# Altium footprint library NX Module baseboard.PcbLib: 96 footprints (part 1 of 6)
Each footprint in its own frame and in the unit in brackets; x right, y up, seen from the top. Pads: shape width x height; smd on the part's side, far side on the other; paste and mask are expansions set on the pad; w line width, h text height; cw(c..) or ccw(c..) is an arc to the next point about the centre after c.
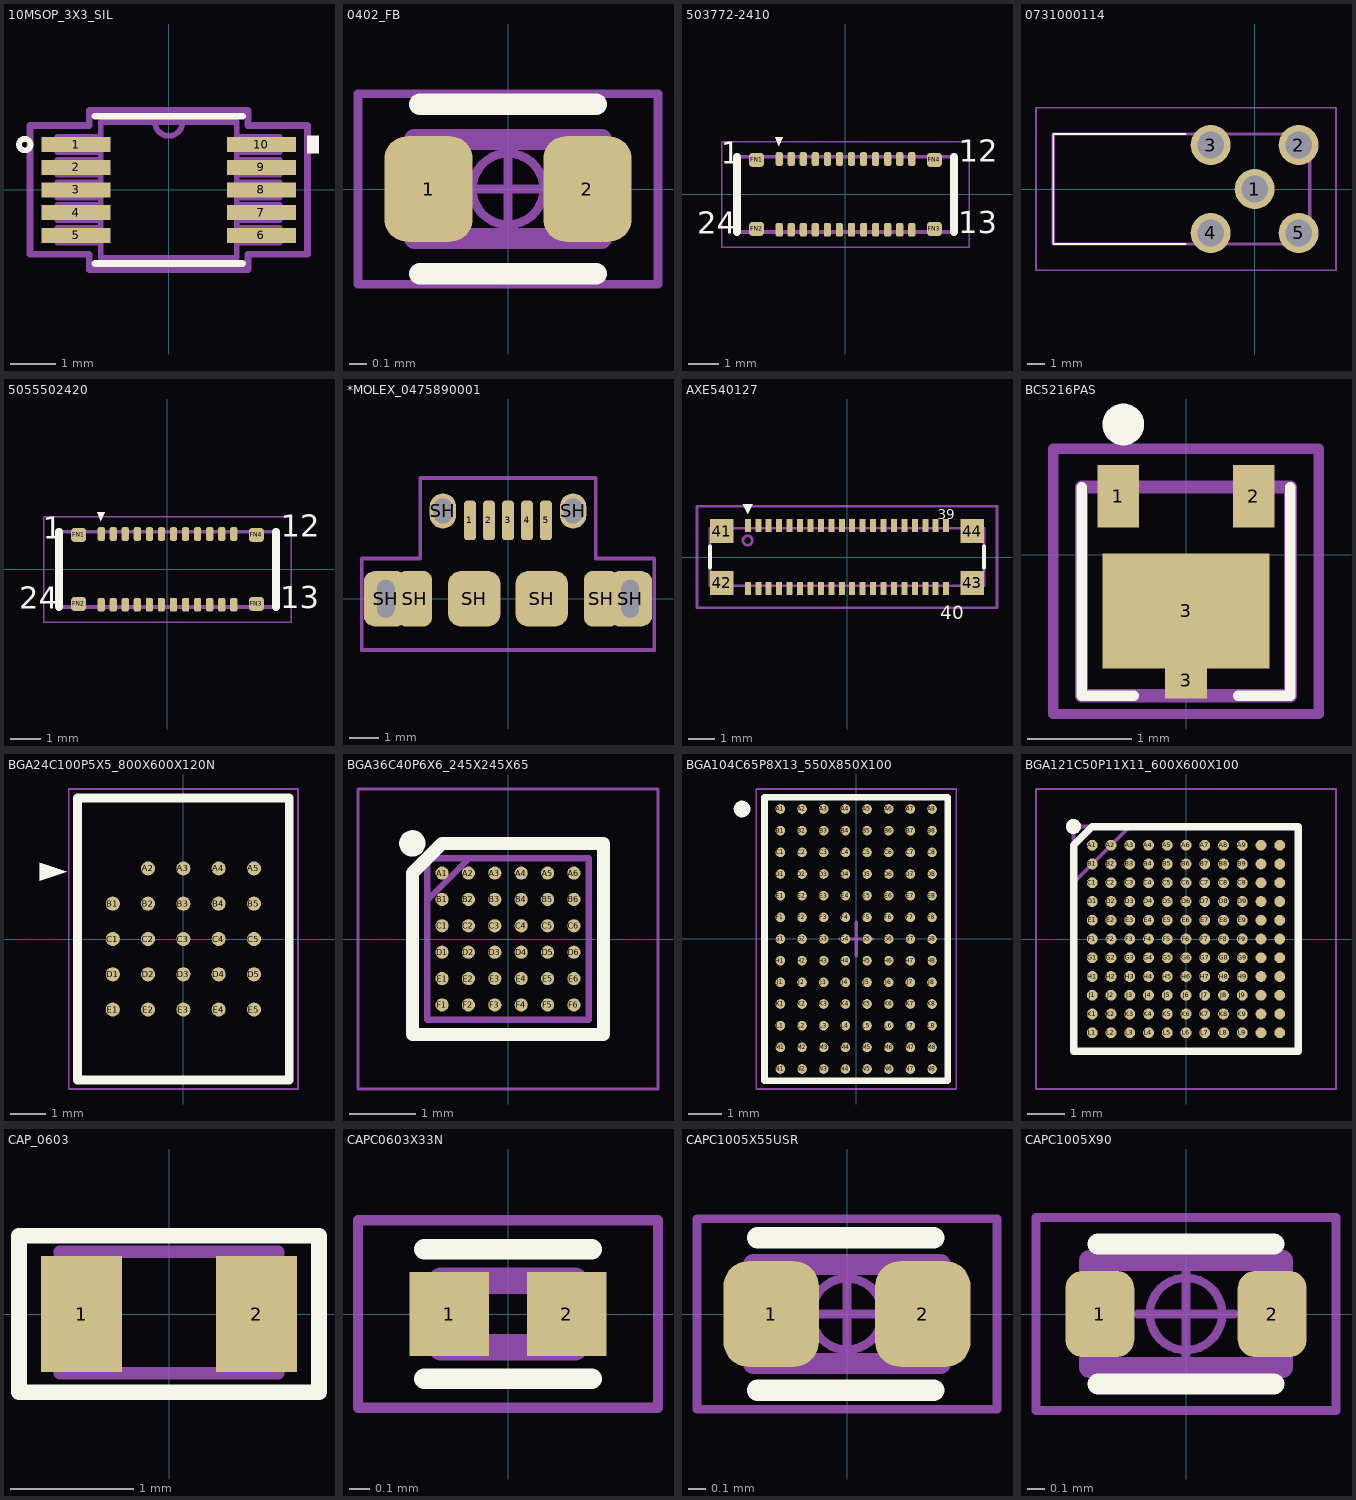
[diagram p0: the footprints below, top view; thin cyan lines are the x and y axes]

## 10MSOP_3X3_SIL [mil]
pads (10):
  rect 60x13 smd paste+0 mask+0: 1(-80.5,39.37) 2(-80.5,19.68) 3(-80.5,0) 4(-80.5,-19.68) 5(-80.5,-39.37) 6(80.5,-39.37) 7(80.5,-19.68) 8(80.5,0) 9(80.5,19.68) 10(80.5,39.37)
Top Overlay:
  circle w5: c-125,39.37 r5
  region: 120.5,46.87 130.5,46.87 130.5,31.87 120.5,31.87
  lines w6: -64,-64 64,-64 ; -64,64 64,64
Mechanical 13:
  lines w5: -12,59 ccw(c0,59) 12,59 ; -96.5,-45.87 -59,-45.87 -59,-32.87 -96.5,-32.87 -96.5,-45.87 ; -96.5,-26.18 -59,-26.18 -59,-13.19 -96.5,-13.19 -96.5,-26.18 ; -96.5,-6.5 -59,-6.5 -59,6.5 -96.5,6.5 -96.5,-6.5 ; -96.5,13.19 -59,13.19 -59,26.18 -96.5,26.18 -96.5,13.19 ; -96.5,32.87 -59,32.87 -59,45.87 -96.5,45.87 -96.5,32.87 ; -59,-59 -59,59 59,59 59,-59 -59,-59 ; 59,-45.87 96.5,-45.87 96.5,-32.87 59,-32.87 59,-45.87 ; 59,-26.18 96.5,-26.18 96.5,-13.19 59,-13.19 59,-26.18 ; 59,-6.5 96.5,-6.5 96.5,6.5 59,6.5 59,-6.5 ; 59,13.19 96.5,13.19 96.5,26.18 59,26.18 59,13.19 ; 59,32.87 96.5,32.87 96.5,45.87 59,45.87 59,32.87
  text ".Designator" at -26.12,-15.85 h60
Mechanical 15:
  lines w6: -120.5,-55.87 -69,-55.87 -69,-69 69,-69 69,-55.87 120.5,-55.87 120.5,55.87 69,55.87 69,69 -69,69 -69,55.87 -120.5,55.87 -120.5,-55.87
3D body "10MSOP_3X3_SIL.step": height 43.11, standoff 0, extent -96.5,-59.02 96.5,59.02

## 0402_FB [mm] "Resistor, Chip; 1.00 mm L X 0.50 mm W X 0.40 mm H body"
height 0.4
pads (2):
  rrect52% 0.5x0.6 smd mask+0.051: 1(-0.45,0) 2(0.45,0)
Top Overlay:
  lines w0.12: -0.5,-0.48 0.5,-0.48 ; -0.5,0.48 0.5,0.48
Mechanical 13:
  lines w0.12: -0.53,-0.28 0.53,-0.28 0.53,0.28 -0.53,0.28 -0.53,-0.28
  text ".Designator" at 0.911,-0.474 h1.52
Mechanical 15:
  circle w0.05: c0,0 r0.202
  lines w0.05: -0.27,0 0.27,0 ; 0,-0.27 0,0.27 ; -0.85,-0.54 0.85,-0.54 0.85,0.54 -0.85,0.54 -0.85,-0.54
3D body "LQP15MN2N7B02D--3DModel-STEP-56544.STEP": height 0.43, standoff -0.02, extent -0.5,-0.25 0.5,0.25

## 503772-2410 [mm]
pads (28):
  rrect50% 0.24x0.45 smd: 1(-2.2,1.175) 2(-1.8,1.175) 3(-1.4,1.175) 4(-1,1.175) 5(-0.6,1.175) 6(-0.2,1.175) 7(0.2,1.175) 8(0.6,1.175) 9(1,1.175) 10(1.4,1.175) 11(1.8,1.175) 12(2.2,1.175) 13(2.2,-1.175) 14(1.8,-1.175) 15(1.4,-1.175) 16(1,-1.175) 17(0.6,-1.175) 18(0.2,-1.175) 19(-0.2,-1.175) 20(-0.6,-1.175) 21(-1,-1.175) 22(-1.4,-1.175) 23(-1.8,-1.175) 24(-2.2,-1.175)
  rrect50% 0.5x0.47 smd: FN1(-2.95,1.145) FN2(-2.95,-1.145) FN3(2.95,-1.145) FN4(2.95,1.145)
Top Overlay:
  region: -2.21,1.6 -2.083,1.905 -2.337,1.905
  lines w0.254: -3.6,-1.25 -3.6,1.25 ; 3.6,-1.25 3.6,1.25
  text "1" at -4.14,0.762 h1.27
  text "12" at 3.759,0.838 h1.27
  text "13" at 3.751,-1.535 h1.27
  text "24" at -4.929,-1.549 h1.27
Mechanical 13:
  lines w0.127: -3.6,-1.25 3.6,-1.25 3.6,1.25 -3.6,1.25 -3.6,-1.25
  text ".Designator" at -0.831,-0.274 h1.27
Mechanical 15:
  lines w0.05: -4.1,-1.75 -4.1,1.75 4.1,1.75 4.1,-1.75 -4.1,-1.75
3D body "5037722410.stp": height 0.66, standoff 0, extent -3.6,-1.25 3.6,1.25

## 0731000114 [mm]
pads (5):
  round 2.31 hole 1.54: 1(0,0) 2(2.54,2.54) 3(-2.54,2.54) 4(-2.54,-2.54) 5(2.54,-2.54)
Top Overlay:
  lines w0.1: -4,-3.175 -11.625,-3.175 -11.625,3.175 -4,3.175
Mechanical 13:
  lines w0.2: -11.625,-3.175 3.175,-3.175 3.175,3.175 -11.625,3.175 -11.625,-3.175
  text ".Designator" at -5.449,-0.365 h1.27
Mechanical 15:
  lines w0.1: -12.625,-4.695 4.695,-4.695 4.695,4.695 -12.625,4.695 -12.625,-4.695
3D body "731000114.stp": height 9.67, standoff -3.83, extent -11.625,-3.175 3.175,3.175

## 5055502420 [mm]
pads (28):
  rrect50% 0.24x0.45 smd: 1(-2.2,1.175) 2(-1.8,1.175) 3(-1.4,1.175) 4(-1,1.175) 5(-0.6,1.175) 6(-0.2,1.175) 7(0.2,1.175) 8(0.6,1.175) 9(1,1.175) 10(1.4,1.175) 11(1.8,1.175) 12(2.2,1.175) 13(2.2,-1.175) 14(1.8,-1.175) 15(1.4,-1.175) 16(1,-1.175) 17(0.6,-1.175) 18(0.2,-1.175) 19(-0.2,-1.175) 20(-0.6,-1.175) 21(-1,-1.175) 22(-1.4,-1.175) 23(-1.8,-1.175) 24(-2.2,-1.175)
  rrect50% 0.5x0.47 smd: FN1(-2.95,1.145) FN2(-2.95,-1.145) FN3(2.95,-1.145) FN4(2.95,1.145)
Top Overlay:
  region: -2.21,1.6 -2.083,1.905 -2.337,1.905
  lines w0.254: -3.6,-1.25 -3.6,1.25 ; 3.6,-1.25 3.6,1.25
  text "1" at -4.14,0.762 h1.27
  text "12" at 3.759,0.838 h1.27
  text "13" at 3.751,-1.535 h1.27
  text "24" at -4.929,-1.549 h1.27
Mechanical 13:
  lines w0.127: -3.55,-1.25 3.55,-1.25 3.55,1.25 -3.55,1.25 -3.55,-1.25
  text ".Designator" at -0.831,-0.274 h1.27
Mechanical 15:
  lines w0.05: -4.1,-1.75 -4.1,1.75 4.1,1.75 4.1,-1.75 -4.1,-1.75
3D body "5055502420.stp": height 0.66, standoff 0, extent -3.55,-1.25 3.55,1.25

## *MOLEX_0475890001 [mm]
pads (13):
  rrect50% 0.4x1.35 smd mask+0.051: 1(-1.3,2.675) 2(-0.65,2.675) 3(0,2.675) 4(0.65,2.675) 5(1.3,2.675)
  rrect50% 1.5x1.9 hole 0.6 slot 1.3 at 90 deg: SH(-4.175,0) SH(4.175,0)
  rrect50% 1.175x1.9 smd: SH(-3.187,0) SH(3.187,0)
  oval 0.9x1.2 hole 0.65 slot 0.85 at 90 deg: SH(-2.225,3) SH(2.225,3)
  rrect50% 1.8x1.9 smd: SH(-1.15,0) SH(1.15,0)
Mechanical 13:
  lines w0.127: -5,-1.75 5,-1.75 5,1.375 3,1.375 3,4.125 -3,4.125 -3,1.375 -5,1.375 -5,-1.75
  text ".Designator" at -1.524,-0.33 h1.27
3D body "475890001.stp": height 2.74, standoff -0.57, extent -4.325,-2.719 4.325,3.175

## AXE540127 [mm]
pads (44):
  rect 0.23x0.5 smd mask+0.05: 1(-3.8,1.2) 2(-3.8,-1.2) 3(-3.4,1.2) 4(-3.4,-1.2) 5(-3,1.2) 6(-3,-1.2) 7(-2.6,1.2) 8(-2.6,-1.2) 9(-2.2,1.2) 10(-2.2,-1.2) 11(-1.8,1.2) 12(-1.8,-1.2) 13(-1.4,1.2) 14(-1.4,-1.2) 15(-1,1.2) 16(-1,-1.2) 17(-0.6,1.2) 18(-0.6,-1.2) 19(-0.2,1.2) 20(-0.2,-1.2) 21(0.2,1.2) 22(0.2,-1.2) 23(0.6,1.2) 24(0.6,-1.2) 25(1,1.2) 26(1,-1.2) 27(1.4,1.2) 28(1.4,-1.2) 29(1.8,1.2) 30(1.8,-1.2) 31(2.2,1.2) 32(2.2,-1.2) 33(2.6,1.2) 34(2.6,-1.2) 35(3,1.2) 36(3,-1.2) 37(3.4,1.2) 38(3.4,-1.2) 39(3.8,1.2) 40(3.8,-1.2)
  rect 0.9x0.92 smd mask+0.05: 41(-4.8,0.99) 42(-4.8,-0.99) 43(4.8,-0.99) 44(4.8,0.99)
Top Overlay:
  region: -3.81,1.651 -3.619,2.032 -4,2.032
  lines w0.152: -5.25,-0.4 -5.25,0.4 ; 5.25,-0.4 5.25,0.4
  text "39" at 3.485,1.31 h0.64
  text "40" at 3.575,-2.566 h0.89
Mechanical 13:
  circle w0.102: c-3.81,0.635 r0.18
  lines w0.102: -5.25,-1.1 -5.25,1.1 5.25,1.1 5.25,-1.1 -5.25,-1.1
  text ".Designator" at -0.43,-0.365 h1.52
Mechanical 15:
  lines w0.1: -5.75,-1.95 -5.75,1.95 5.75,1.95 5.75,-1.95 -5.75,-1.95
3D body "axe540127.step": height 0.77, standoff 0, extent -5.25,-1.25 5.25,1.25

## BC5216PAS [mm]
pads (4):
  rect 0.4x0.6 smd mask+0.051: 1(-0.65,0.563) 2(0.65,0.563)
  rect 0.4x0.35 smd mask+0.051: 3(0,-1.2)
  rect 1.6x1.1 smd mask+0.051: 3(0,-0.537)
Top Overlay:
  lines w0.1: -1,0.65 -1,-1.35 -0.5,-1.35 ; 0.5,-1.35 1,-1.35 1,0.65
  lines w0.2: -0.7,1.25 cw(c-0.6,1.25) -0.5,1.25 cw(c-0.6,1.25) -0.7,1.25
Mechanical 13:
  lines w0.127: -1,-1.35 1,-1.35 1,0.65 -1,0.65 -1,-1.35
  text ".Designator" at -0.543,-0.683 h1.27
Mechanical 15:
  lines w0.1: -1.27,-1.524 -1.27,1.016 1.27,1.016 1.27,-1.524 -1.27,-1.524

## BGA24C100P5X5_800X600X120N [mm]
pads (24):
  round 0.4 smd mask+0.05: A2(-1,2) A3(0,2) A4(1,2) A5(2,2) B1(-2,1) B2(-1,1) B3(0,1) B4(1,1) B5(2,1) C1(-2,0) C2(-1,0) C3(0,0) C4(1,0) C5(2,0) D1(-2,-1) D2(-1,-1) D3(0,-1) D4(1,-1) D5(2,-1) E1(-2,-2) E2(-1,-2) E3(0,-2) E4(1,-2) E5(2,-2)
Top Overlay:
  region: -3.302,1.905 -4.064,2.159 -4.064,1.651
  lines w0.254: -3,-4 -3,4 3,4 3,-4 -3,-4
Mechanical 13:
  region: -3.302,1.905 -4.064,2.159 -4.064,1.651
  lines w0.127: -3,-4 -3,4 3,4 3,-4 -3,-4
  text ".Designator" at 0.381,-0.33 h1.27
Mechanical 15:
  lines w0.05: -3.25,-4.25 -3.25,4.25 3.25,4.25 3.25,-4.25 -3.25,-4.25
3D body "IS66WVH16M8ALL-166B1LI--3DModel-STEP-56544.STEP": height 1.2, standoff 0, extent -3,-4 3,4

## BGA36C40P6X6_245X245X65 [mm]
pads (36):
  round 0.2 smd: A1(-1,1) A2(-0.6,1) A3(-0.2,1) A4(0.2,1) A5(0.6,1) A6(1,1) B1(-1,0.6) B2(-0.6,0.6) B3(-0.2,0.6) B4(0.2,0.6) B5(0.6,0.6) B6(1,0.6) C1(-1,0.2) C2(-0.6,0.2) C3(-0.2,0.2) C4(0.2,0.2) C5(0.6,0.2) C6(1,0.2) D1(-1,-0.2) D2(-0.6,-0.2) D3(-0.2,-0.2) D4(0.2,-0.2) D5(0.6,-0.2) D6(1,-0.2) E1(-1,-0.6) E2(-0.6,-0.6) E3(-0.2,-0.6) E4(0.2,-0.6) E5(0.6,-0.6) E6(1,-0.6) F1(-1,-1) F2(-0.6,-1) F3(-0.2,-1) F4(0.2,-1) F5(0.6,-1) F6(1,-1)
Top Overlay:
  circle w0.2: c-1.45,1.45 r0.1
  lines w0.2: -1.45,-1.45 1.45,-1.45 1.45,1.45 -1,1.45 -1.45,1 -1.45,-1.45
Mechanical 13:
  lines w0.1: -1.225,0.588 -0.587,1.226 ; -1.225,-1.225 1.225,-1.225 1.225,1.225 -1.225,1.225 -1.225,-1.225
Mechanical 15:
  lines w0.05: -2.275,-2.275 2.275,-2.275 2.275,2.275 -2.275,2.275 -2.275,-2.275
3D body "TMUX646ZECR.stp": height 0.65, standoff 0, extent -1.225,-1.225 1.225,1.225

## BGA104C65P8X13_550X850X100 [mm] "BGA, 104-Leads, Body 5.50x8.50mmx1.00mm, Pitch 0.65mm"
height 1
pads (104):
  round 0.29 smd mask+0.051: A1(-2.275,3.9) A2(-1.625,3.9) A3(-0.975,3.9) A4(-0.325,3.9) A5(0.325,3.9) A6(0.975,3.9) A7(1.625,3.9) A8(2.275,3.9) B1(-2.275,3.25) B2(-1.625,3.25) B3(-0.975,3.25) B4(-0.325,3.25) B5(0.325,3.25) B6(0.975,3.25) B7(1.625,3.25) B8(2.275,3.25) C1(-2.275,2.6) C2(-1.625,2.6) C3(-0.975,2.6) C4(-0.325,2.6) C5(0.325,2.6) C6(0.975,2.6) C7(1.625,2.6) C8(2.275,2.6) D1(-2.275,1.95) D2(-1.625,1.95) D3(-0.975,1.95) D4(-0.325,1.95) D5(0.325,1.95) D6(0.975,1.95) D7(1.625,1.95) D8(2.275,1.95) E1(-2.275,1.3) E2(-1.625,1.3) E3(-0.975,1.3) E4(-0.325,1.3) E5(0.325,1.3) E6(0.975,1.3) E7(1.625,1.3) E8(2.275,1.3) F1(-2.275,0.65) F2(-1.625,0.65) F3(-0.975,0.65) F4(-0.325,0.65) F5(0.325,0.65) F6(0.975,0.65) F7(1.625,0.65) F8(2.275,0.65) G1(-2.275,0) G2(-1.625,0) G3(-0.975,0) G4(-0.325,0) G5(0.325,0) G6(0.975,0) G7(1.625,0) G8(2.275,0) H1(-2.275,-0.65) H2(-1.625,-0.65) H3(-0.975,-0.65) H4(-0.325,-0.65) H5(0.325,-0.65) H6(0.975,-0.65) H7(1.625,-0.65) H8(2.275,-0.65) J1(-2.275,-1.3) J2(-1.625,-1.3) J3(-0.975,-1.3) J4(-0.325,-1.3) J5(0.325,-1.3) J6(0.975,-1.3) J7(1.625,-1.3) J8(2.275,-1.3) K1(-2.275,-1.95) K2(-1.625,-1.95) K3(-0.975,-1.95) K4(-0.325,-1.95) K5(0.325,-1.95) K6(0.975,-1.95) K7(1.625,-1.95) K8(2.275,-1.95) L1(-2.275,-2.6) L2(-1.625,-2.6) L3(-0.975,-2.6) L4(-0.325,-2.6) L5(0.325,-2.6) L6(0.975,-2.6) L7(1.625,-2.6) L8(2.275,-2.6) M1(-2.275,-3.25) M2(-1.625,-3.25) M3(-0.975,-3.25) M4(-0.325,-3.25) M5(0.325,-3.25) M6(0.975,-3.25) M7(1.625,-3.25) M8(2.275,-3.25) N1(-2.275,-3.9) N2(-1.625,-3.9) N3(-0.975,-3.9) N4(-0.325,-3.9) N5(0.325,-3.9) N6(0.975,-3.9) N7(1.625,-3.9) N8(2.275,-3.9)
Top Overlay:
  circle w0.25: c-3.425,3.9 r0.125
  lines w0.2: -2.75,-4.25 2.75,-4.25 2.75,4.25 -2.75,4.25 -2.75,-4.25
Top Courtyard:
  lines w0.05: -3,-4.5 3,-4.5 3,4.5 -3,4.5 -3,-4.5
  lines w0.1: -0.5,0 0.5,0 ; 0,-0.5 0,0.5
Mechanical 13:
  lines w0.1: -2.75,-4.25 -2.75,4.25 2.75,4.25 2.75,-4.25 -2.75,-4.25
  text ".Designator" at -0.368,-0.336 h1.27
3D body: height 1, standoff 0.1, extent -2.75,-4.25 2.75,4.25

## BGA121C50P11X11_600X600X100 [mm]
pads (121):
  round 0.29 smd mask+0.05: A1(-2.5,2.5) A2(-2,2.5) A3(-1.5,2.5) A4(-1,2.5) A5(-0.5,2.5) A6(0,2.5) A7(0.5,2.5) A8(1,2.5) A9(1.5,2.5) A10(2,2.5) A11(2.5,2.5) B1(-2.5,2) B2(-2,2) B3(-1.5,2) B4(-1,2) B5(-0.5,2) B6(0,2) B7(0.5,2) B8(1,2) B9(1.5,2) B10(2,2) B11(2.5,2) C1(-2.5,1.5) C2(-2,1.5) C3(-1.5,1.5) C4(-1,1.5) C5(-0.5,1.5) C6(0,1.5) C7(0.5,1.5) C8(1,1.5) C9(1.5,1.5) C10(2,1.5) C11(2.5,1.5) D1(-2.5,1) D2(-2,1) D3(-1.5,1) D4(-1,1) D5(-0.5,1) D6(0,1) D7(0.5,1) D8(1,1) D9(1.5,1) D10(2,1) D11(2.5,1) E1(-2.5,0.5) E2(-2,0.5) E3(-1.5,0.5) E4(-1,0.5) E5(-0.5,0.5) E6(0,0.5) E7(0.5,0.5) E8(1,0.5) E9(1.5,0.5) E10(2,0.5) E11(2.5,0.5) F1(-2.5,0) F2(-2,0) F3(-1.5,0) F4(-1,0) F5(-0.5,0) F6(0,0) F7(0.5,0) F8(1,0) F9(1.5,0) F10(2,0) F11(2.5,0) G1(-2.5,-0.5) G2(-2,-0.5) G3(-1.5,-0.5) G4(-1,-0.5) G5(-0.5,-0.5) G6(0,-0.5) G7(0.5,-0.5) G8(1,-0.5) G9(1.5,-0.5) G10(2,-0.5) G11(2.5,-0.5) H1(-2.5,-1) H2(-2,-1) H3(-1.5,-1) H4(-1,-1) H5(-0.5,-1) H6(0,-1) H7(0.5,-1) H8(1,-1) H9(1.5,-1) H10(2,-1) H11(2.5,-1) J1(-2.5,-1.5) J2(-2,-1.5) J3(-1.5,-1.5) J4(-1,-1.5) J5(-0.5,-1.5) J6(0,-1.5) J7(0.5,-1.5) J8(1,-1.5) J9(1.5,-1.5) J10(2,-1.5) J11(2.5,-1.5) K1(-2.5,-2) K2(-2,-2) K3(-1.5,-2) K4(-1,-2) K5(-0.5,-2) K6(0,-2) K7(0.5,-2) K8(1,-2) K9(1.5,-2) K10(2,-2) K11(2.5,-2) L1(-2.5,-2.5) L2(-2,-2.5) L3(-1.5,-2.5) L4(-1,-2.5) L5(-0.5,-2.5) L6(0,-2.5) L7(0.5,-2.5) L8(1,-2.5) L9(1.5,-2.5) L10(2,-2.5) L11(2.5,-2.5)
Top Overlay:
  circle w0.2: c-3,3 r0.1
  lines w0.2: -3,-3 3,-3 3,3 -2.5,3 -3,2.5 -3,-3
Mechanical 13:
  lines w0.1: -3,1.5 -1.5,3 ; -3,-3 -3,3 3,3 3,-3 -3,-3
  text ".Designator" at -0.09,-0.345 h1.27
Mechanical 15:
  lines w0.05: -4,-4 4,-4 4,4 -4,4 -4,-4
3D body "LIFCL-40-8MG121C.stp": height 1, standoff 0, extent -3,-3 3,3

## CAP_0603 [mil]
pads (2):
  rect 26x37 smd mask+1.97: 1(-28,0) 2(28,0)
Top Overlay:
  lines w5: -48,-25 48,-25 48,25 -48,25 -48,-25
Mechanical 13:
  lines w4: -35,-19 -35,20 35,20 35,-19 -35,-19
  text ".Designator" at -30,-10 h40
Mechanical 15:
  lines w2: -48,-25 48,-25 48,25 -48,25 -48,-25
3D body "C0603C475K9PACTU.stp": height 35.43, standoff 0, extent -34.44,-18.7 34.45,18.7

## CAPC0603X33N [mm]
pads (2):
  rect 0.38x0.4 smd mask+0.025: 1(-0.281,0) 2(0.281,0)
Top Overlay:
  lines w0.1: -0.4,-0.31 0.4,-0.31 ; -0.4,0.31 0.4,0.31
Mechanical 13:
  lines w0.127: -0.32,-0.16 0.32,-0.16 0.32,0.16 -0.32,0.16 -0.32,-0.16
  text ".Designator" at 0.801,-0.355 h1.27
Mechanical 15:
  lines w0.05: -0.718,-0.448 0.718,-0.448 0.718,0.448 -0.718,0.448 -0.718,-0.448
3D body "C0603X7S1A104K030BC.STEP": height 0.33, standoff 0, extent -0.3,-0.15 0.3,0.15

## CAPC1005X55USR [mm] "Capacitor, Chip; 1.00 mm L X 0.50 mm W X 0.55 mm H body"
height 0.55
pads (2):
  rrect52% 0.54x0.6 smd mask+0.051: 1(-0.43,0) 2(0.43,0)
Top Overlay:
  lines w0.12: -0.508,-0.432 0.492,-0.432 ; -0.508,0.432 0.492,0.432
Mechanical 13:
  lines w0.12: -0.53,-0.28 0.53,-0.28 0.53,0.28 -0.53,0.28 -0.53,-0.28
  text ".Designator" at 0.911,-0.522 h1.27
Mechanical 15:
  circle w0.05: c0,0 r0.202
  lines w0.05: -0.27,0 0.27,0 ; 0,-0.27 0,0.27 ; -0.85,-0.54 0.85,-0.54 0.85,0.54 -0.85,0.54 -0.85,-0.54
3D body "CAPC1005X55USR.STEP": height 0.55, standoff 0, extent -0.5,-0.25 0.5,0.25

## CAPC1005X90 [mm] "Capacitor, Chip; 1.016 mm L X 0.508 mm W X 0.61 mm H body"
height 0.61
pads (2):
  rrect51% 0.4x0.5 smd mask+0.025: 1(-0.5,0) 2(0.5,0)
Top Overlay:
  lines w0.12: -0.51,-0.406 0.51,-0.406 ; -0.51,0.406 0.51,0.406
Mechanical 13:
  lines w0.12: -0.56,-0.31 0.56,-0.31 0.56,0.31 -0.56,0.31 -0.56,-0.31
  text ".Designator" at 0.911,-0.522 h1.27
Mechanical 15:
  circle w0.05: c0,0 r0.21
  lines w0.05: -0.28,0 0.28,0 ; 0,-0.28 0,0.28 ; -0.87,-0.56 0.87,-0.56 0.87,0.56 -0.87,0.56 -0.87,-0.56
3D body "CL05A106MP8NUB8.STEP": height 0.55, standoff 0, extent -0.5,-0.25 0.5,0.25